# Altium footprint library CM3Board.PcbLib: 127 footprints (part 3 of 8)
Each footprint in its own frame and in the unit in brackets; x right, y up, seen from the top. Pads: shape width x height; smd on the part's side, far side on the other; paste and mask are expansions set on the pad; w line width, h text height; cw(c..) or ccw(c..) is an arc to the next point about the centre after c.
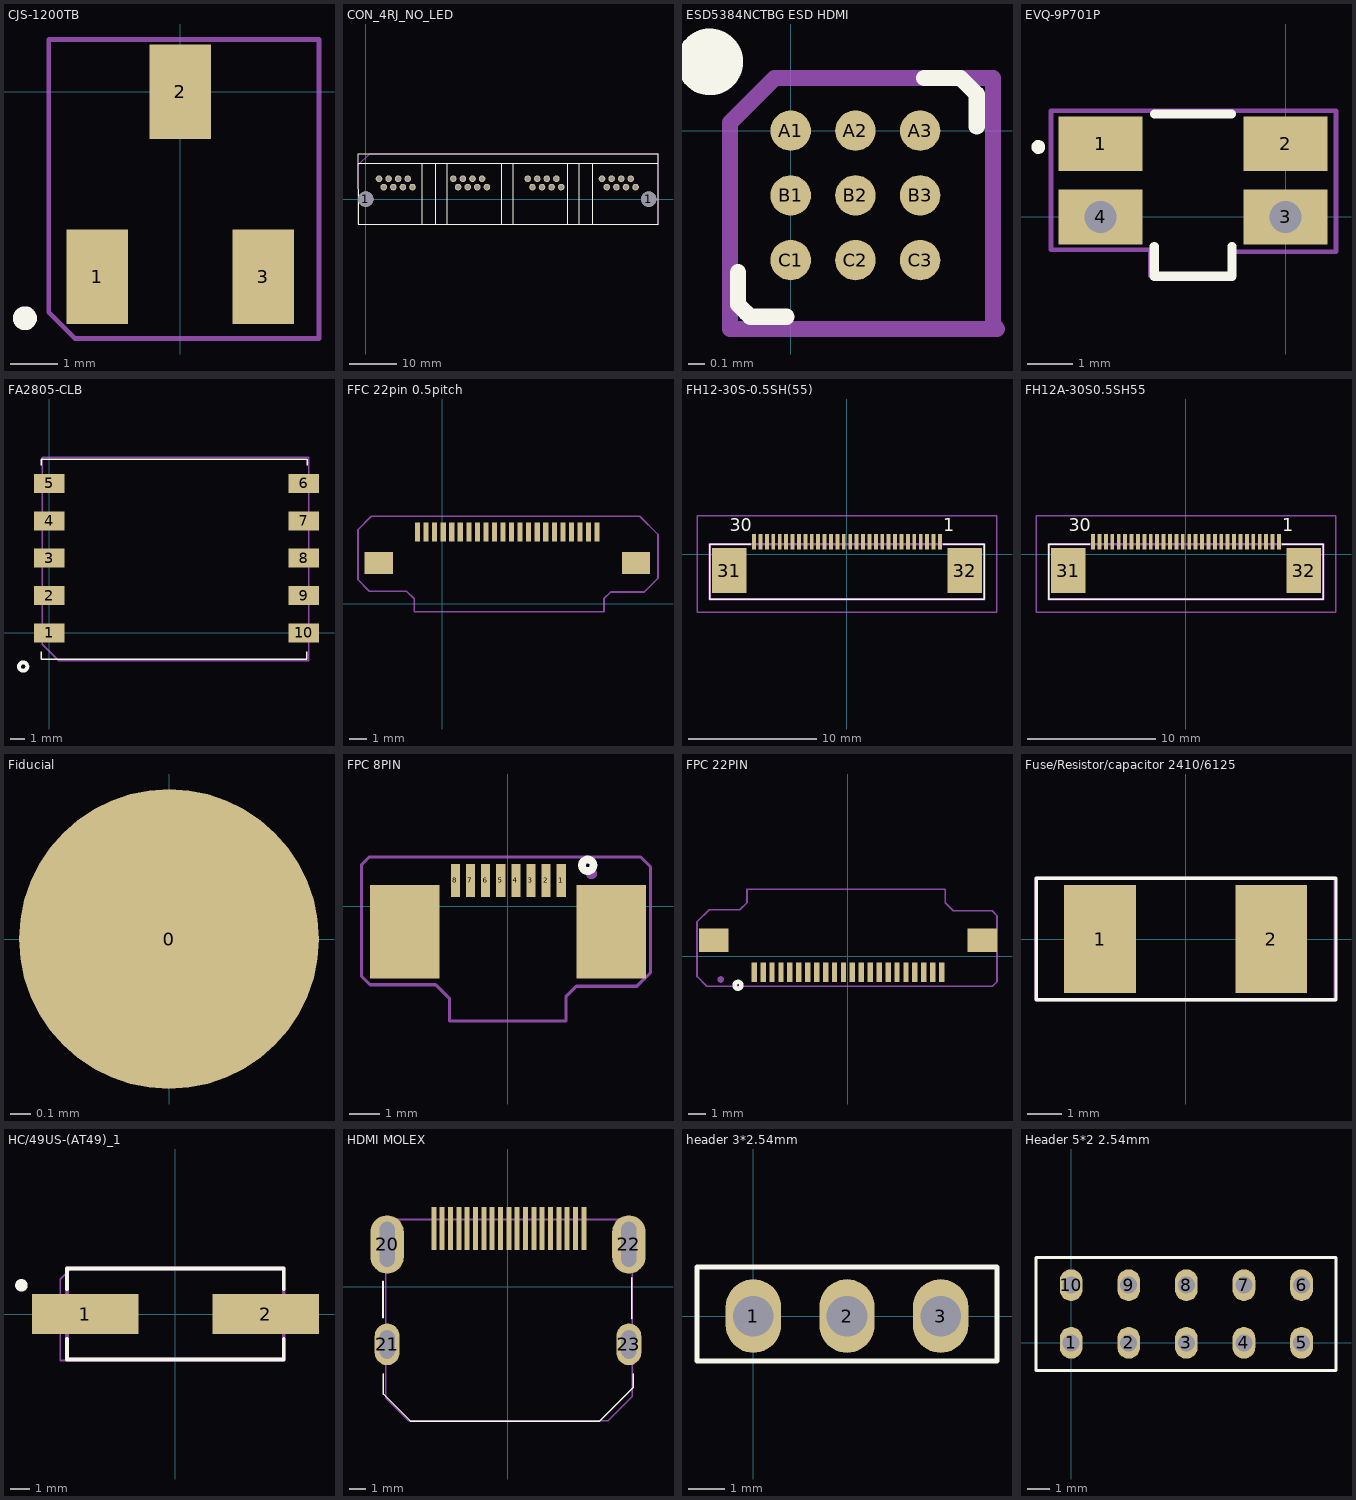
[diagram p2: the footprints below, top view; thin cyan lines are the x and y axes]

## CJS-1200TB [mm]
pads (3):
  rect 1.3x2 smd: 1(-1.75,-3.9) 2(0,0) 3(1.75,-3.9)
Top Overlay:
  circle w0.254: c-3.275,-4.775 r0.125
Mechanical 29:
  lines w0.1: -2.775,-4.65 -2.225,-5.2 2.925,-5.2 2.925,1.1 -2.775,1.1 -2.775,-4.65
  text ".Designator" at -0.825,-1.95 h1

## CON_4RJ_NO_LED [mm] "CON_4RJ_NO_LED"
pads (34):
  round 3.251 hole 3.251 unplated: 1(0,0) 1(59.94,0)
  round 1.4 / inner round 1.524 / far side round 1.4 hole 0.92: 1-1(9.895,2.54) 1-2(8.88,4.32) 1-3(7.865,2.54) 1-4(6.85,4.32) 1-5(5.835,2.54) 1-6(4.82,4.32) 1-7(3.805,2.54) 1-8(2.79,4.32) 2-1(25.645,2.54) 2-2(24.63,4.32) 2-3(23.615,2.54) 2-4(22.6,4.32) 2-5(21.585,2.54) 2-6(20.57,4.32) 2-7(19.555,2.54) 2-8(18.54,4.32) 3-1(41.395,2.54) 3-2(40.38,4.32) 3-3(39.365,2.54) 3-4(38.35,4.32) 3-5(37.335,2.54) 3-6(36.32,4.32) 3-7(35.305,2.54) 3-8(34.29,4.32) 4-1(57.145,2.54) 4-2(56.13,4.32) 4-3(55.115,2.54) 4-4(54.1,4.32) 4-5(53.085,2.54) 4-6(52.07,4.32) 4-7(51.055,2.54) 4-8(50.04,4.32)
Top Overlay:
  lines w0.152: 3.279,7.609 14.811,7.609 14.811,-5.243 ; 11.966,-5.294 11.966,7.457 ; 17.249,-5.243 17.249,7.609 28.781,7.609 28.781,-5.243 ; 31.219,-5.243 31.219,7.609 42.751,7.609 42.751,-5.243 ; 45.189,-5.243 45.189,7.609 56.721,7.609 ; 48.034,-5.294 48.034,7.482
  lines w0.2: -1.636,7.618 61.9,7.618
  lines w0.254: -1.654,9.584 61.9,9.599 61.9,-5.35 -1.624,-5.35 -1.654,9.586
Mechanical 29:
  lines w0.1: -1.575,-5.3 61.875,-5.3 61.9,-5.275 61.9,9.575 61.85,9.625 0.825,9.625 -1.575,7.225 -1.575,-5.3
  text ".Designator" at 27.35,-1.525 h1
3D body "ACC-M-RJHSE-5080-04-REVT2.step": height 13.16, standoff -3.15, extent -1.567,-5.193 61.425,9.793

## ESD5384NCTBG ESD HDMI [mm]
pads (9):
  round 0.25 smd: A1(0,0) A2(0.4,0) A3(0.8,0) B1(0,-0.4) B2(0.4,-0.4) B3(0.8,-0.4) C1(0,-0.8) C2(0.4,-0.8) C3(0.8,-0.8)
Top Overlay:
  circle w0.254: c-0.5,0.425 r0.079
  lines w0.1: -0.325,-0.875 -0.325,-1.075 -0.275,-1.125 -0.25,-1.15 -0.025,-1.15 ; 0.825,0.325 1.05,0.325 1.15,0.225 1.15,0.025
Mechanical 29:
  lines w0.1: -0.375,-1.225 -0.375,0.05 -0.1,0.325 1.25,0.325 1.25,-1.2 1.275,-1.225 -0.375,-1.225
  text ".Designator" at 0.125,-0.675 h1
3D body "ESD5384NCTBG.stp": height 0.63, standoff 0, extent -0.17,-0.97 0.97,0.17

## EVQ-9P701P [mm]
pads (4):
  rect 1.84x1.2 smd: 1(-4.05,1.6) 2(0,1.6)
  rect 1.84x1.2 hole 0.7: 3(0,0) 4(-4.05,0)
Top Overlay:
  circle w0.2: c-5.412,1.529 r0.051
  lines w0.2: -2.875,-0.65 -2.875,-1.3 -1.175,-1.3 -1.175,-0.65 ; -2.867,2.25 -1.183,2.25
Mechanical 29:
  lines w0.1: -5.135,-0.72 -5.135,2.32 1.105,2.32 1.105,-0.76 -1.165,-0.76 -1.165,-1.29 -2.965,-1.29 -2.965,-0.72 -5.135,-0.72
  text ".Designator" at -4.955,0.28 h1.52
3D body "EVQ-9P7_P34-01P.STEP": height 1.35, standoff -0.6, extent -4.375,-1.29 0.325,2.404

## FA2805-CLB [mm]
pads (10):
  rect 2.03x1.27 smd: 1(0,0) 2(0,2.5) 3(0,5) 4(0,7.5) 5(0,10) 6(17.02,10) 7(17.02,7.5) 8(17.02,5) 9(17.02,2.5) 10(17.02,0)
Top Overlay:
  circle w0.254: c-1.75,-2.25 r0.28
  lines w0.1: -0.55,11.225 -0.55,11.625 17.25,11.625 17.25,11.225 ; -0.525,-1.25 -0.525,-1.775 17.225,-1.775 17.225,-1.25
Mechanical 29:
  lines w0.1: -0.475,-0.75 0.625,-1.85 17.35,-1.85 17.35,11.75 -0.475,11.75 -0.475,-0.75
  text ".Designator" at 4.65,3.775 h1
3D body "FA2805-CLB.stp": height 12.7, standoff 0, extent -0.525,-1.78 17.225,11.68

## FFC 22pin 0.5pitch [mm]
pads (24):
  rect 0.3x1.1 smd: 1(-1.44,4.202) 2(-0.94,4.202) 3(-0.44,4.202) 4(0.06,4.202) 5(0.56,4.202) 6(1.06,4.202) 7(1.56,4.202) 8(2.06,4.202) 9(2.56,4.202) 10(3.06,4.202) 11(3.56,4.202) 12(4.06,4.202) 13(4.56,4.202) 14(5.06,4.202) 15(5.56,4.202) 16(6.06,4.202) 17(6.56,4.202) 18(7.06,4.202) 19(7.56,4.202) 20(8.06,4.202) 21(8.56,4.202) 22(9.06,4.202)
  rect 1.65x1.3 smd: ""(-3.715,2.402) ""(11.335,2.402)
Mechanical 29:
  lines w0.1: -4.925,1.412 -4.265,0.752 -2.09,0.752 -1.64,0.302 -1.64,-0.448 9.46,-0.448 9.46,0.302 9.86,0.702 11.827,0.702 12.625,1.5 12.625,4.062 11.562,5.125 -4.142,5.125 -4.925,4.342 -4.925,1.412
  text ".Designator" at -0.265,2.302 h1
3D body "FFC22_545482271.stp": height 1.18, standoff -0.02, extent -4.29,-0.548 11.91,4.452

## FH12-30S-0.5SH(55) [mm]
pads (32):
  rect 0.3x1.2 smd: 1(7.25,0.97) 2(6.75,0.97) 3(6.25,0.97) 4(5.75,0.97) 5(5.25,0.97) 6(4.75,0.97) 7(4.25,0.97) 8(3.75,0.97) 9(3.25,0.97) 10(2.75,0.97) 11(2.25,0.97) 12(1.75,0.97) 13(1.25,0.97) 14(0.75,0.97) 15(0.25,0.97) 16(-0.25,0.97) 17(-0.75,0.97) 18(-1.25,0.97) 19(-1.75,0.97) 20(-2.25,0.97) 21(-2.75,0.97) 22(-3.25,0.97) 23(-3.75,0.97) 24(-4.25,0.97) 25(-4.75,0.97) 26(-5.25,0.97) 27(-5.75,0.97) 28(-6.25,0.97) 29(-6.75,0.97) 30(-7.25,0.97)
  rect 2.7x3.5 smd: 31(-9.18,-1.3) 32(9.18,-1.3)
Top Overlay:
  lines w0.1: -7.5,0.77 -10.7,0.77 -10.7,-3.53 10.7,-3.53 10.7,0.77 7.5,0.77
  text "1" at 7.5,1.76 h1
  text "30" at -9.144,1.76 h1
Mechanical 13:
  lines w0.2: -10.7,-3.53 -10.7,0.77 10.7,0.77 10.7,-3.53 -10.7,-3.53
Mechanical 15:
  lines w0.1: -11.7,-4.53 -11.7,2.97 11.7,2.97 11.7,-4.53 -11.7,-4.53
Mechanical 29:
  text ".Designator" at -3.556,-2.304 h1
3D body "FH12-30S-0.5SH.stp": height 2.04, standoff -0.06, extent -9.55,-5.257 9.55,1.143

## FH12A-30S0.5SH55 [mm]
pads (32):
  rect 0.3x1.2 smd: 1(7.25,0.97) 2(6.75,0.97) 3(6.25,0.97) 4(5.75,0.97) 5(5.25,0.97) 6(4.75,0.97) 7(4.25,0.97) 8(3.75,0.97) 9(3.25,0.97) 10(2.75,0.97) 11(2.25,0.97) 12(1.75,0.97) 13(1.25,0.97) 14(0.75,0.97) 15(0.25,0.97) 16(-0.25,0.97) 17(-0.75,0.97) 18(-1.25,0.97) 19(-1.75,0.97) 20(-2.25,0.97) 21(-2.75,0.97) 22(-3.25,0.97) 23(-3.75,0.97) 24(-4.25,0.97) 25(-4.75,0.97) 26(-5.25,0.97) 27(-5.75,0.97) 28(-6.25,0.97) 29(-6.75,0.97) 30(-7.25,0.97)
  rect 2.7x3.5 smd: 31(-9.18,-1.3) 32(9.18,-1.3)
Top Overlay:
  lines w0.1: -7.5,0.77 -10.7,0.77 -10.7,-3.53 10.7,-3.53 10.7,0.77 7.5,0.77
  text "30" at -9.144,1.76 h1
  text "1" at 7.5,1.76 h1
Mechanical 13:
  lines w0.2: -10.7,-3.53 10.7,-3.53 10.7,0.77 -10.7,0.77 -10.7,-3.53
Mechanical 15:
  lines w0.1: -11.7,-4.53 11.7,-4.53 11.7,2.97 -11.7,2.97 -11.7,-4.53
Mechanical 29:
  text ".Designator" at -3.556,-2.304 h1
3D body "FH12A-30S-0.5SH.stp": height 2.15, standoff 0, extent -9.75,-5.857 9.75,1.143

## Fiducial [mm]
pads (1):
  round 1.5 smd paste-1 mask+3: 0(0,0)

## FPC 8PIN [mm]
pads (10):
  rect 0.3x1.1 smd: 1(1.76,0.85) 2(1.26,0.85) 3(0.76,0.85) 4(0.26,0.85) 5(-0.24,0.85) 6(-0.74,0.85) 7(-1.24,0.85) 8(-1.74,0.85)
  rect 2.3x3.1 smd: ""(-3.41,-0.85) ""(3.41,-0.85)
Top Overlay:
  circle w0.254: c2.635,1.35 r0.19
Mechanical 29:
  circle w0.254: c2.76,1.075 r0.056
  lines w0.1: -4.84,-2.325 -4.84,1.375 -4.59,1.625 4.385,1.625 4.71,1.3 4.71,-2.2 4.26,-2.65 2.26,-2.65 1.91,-3 1.91,-3.8 -1.94,-3.8 -1.94,-3.05 -2.39,-2.6 -4.565,-2.6 -4.84,-2.325
  text ".Designator" at -3.89,-0.95 h1
3D body "TE-8PFC.stp": height 2.1, standoff 0.05, extent -4.705,-3.86 4.725,1.25

## FPC 22PIN [mm]
pads (24):
  rect 0.3x1.1 smd: 1(-5.25,-0.9) 2(-4.75,-0.9) 3(-4.25,-0.9) 4(-3.75,-0.9) 5(-3.25,-0.9) 6(-2.75,-0.9) 7(-2.25,-0.9) 8(-1.75,-0.9) 9(-1.25,-0.9) 10(-0.75,-0.9) 11(-0.25,-0.9) 12(0.25,-0.9) 13(0.75,-0.9) 14(1.25,-0.9) 15(1.75,-0.9) 16(2.25,-0.9) 17(2.75,-0.9) 18(3.25,-0.9) 19(3.75,-0.9) 20(4.25,-0.9) 21(4.75,-0.9) 22(5.25,-0.9)
  rect 1.65x1.3 smd: ""(-7.525,0.9) ""(7.525,0.9)
Top Overlay:
  circle w0.254: c-6.15,-1.625 r0.19
Mechanical 29:
  circle w0.254: c-7.125,-1.3 r0.056
  lines w0.1: -8.45,-1.125 -7.9,-1.675 8.1,-1.675 8.35,-1.425 8.35,2.275 8.075,2.55 5.9,2.55 5.45,3 5.45,3.75 -5.65,3.75 -5.65,3 -6.05,2.6 -7.775,2.6 -8.45,1.925 -8.45,-1.125
  text ".Designator" at 4.075,1 h1
3D body "FFC22_545482271.stp": height 1.18, standoff -0.02, extent -8.1,-1.15 8.1,3.85

## Fuse/Resistor/capacitor 2410/6125 [mm]
pads (2):
  rect 2.1x3.15 smd: 1(-2.5,0) 2(2.5,0)
Top Overlay:
  lines w0.1: -4.37,-1.778 -4.37,1.778 4.393,1.778 4.393,-1.778 -4.37,-1.778
Mechanical 29:
  lines w0.1: -4.375,-1.75 -4.375,1.775 4.35,1.775 4.375,1.75 4.375,-1.775 -4.35,-1.775 -4.375,-1.75
  text ".Designator" at -4.15,-1.375 h1
3D body "User Library-Fuse2.step": height 2.47, standoff -0.13, extent -3,-1.35 3.1,1.25

## HC/49US-(AT49)_1 [mm]
pads (2):
  rect 5.6x2.1 smd: 1(-4.75,0) 2(4.75,0)
Top Overlay:
  circle w0.4: c-8.105,1.51 r0.126
  lines w0.2: -5.7,-1.3 -5.7,-2.4 5.7,-2.4 5.7,-1.3 ; -5.7,1.3 -5.7,2.4 5.7,2.4 5.7,1.3
Mechanical 13:
  lines w0.2: -5.7,-2.4 5.7,-2.4 5.7,2.4 -5.7,2.4 -5.7,-2.4
Mechanical 29:
  lines w0.1: -6.06,-2.45 5.74,-2.45 5.74,2.38 -5.52,2.38 -6.06,1.84 -6.06,-2.45
  text ".Designator" at -3.16,-1.36 h1.52
3D body "User Library-HC49US.STEP": height 4.2, standoff 0, extent -6.16,-2.35 6.54,2.35

## HDMI MOLEX [mm] "Modelo 471511051"
pads (23):
  rect 0.3x2.6 smd: 1(4.55,3.475) 2(4.05,3.475) 3(3.55,3.475) 4(3.05,3.475) 5(2.55,3.475) 6(2.05,3.475) 7(1.55,3.475) 8(1.05,3.475) 9(0.55,3.475) 10(0.05,3.475) 11(-0.45,3.475) 12(-0.95,3.475) 13(-1.45,3.475) 14(-1.95,3.475) 15(-2.45,3.475) 16(-2.95,3.475) 17(-3.45,3.475) 18(-3.95,3.475) 19(-4.45,3.475)
  oval 2x3.5 hole 0.9 slot 2.7 at 90 deg: 20(-7.25,2.525) 22(7.25,2.525)
  oval 1.5x2.5 hole 0.9 slot 1.7 at 90 deg: 21(-7.25,-3.475) 23(7.25,-3.475)
Top Overlay:
  lines w0.1: -7.5,-1.875 -7.5,0.3 ; -7.475,-5.25 -7.475,-6.45 -5.85,-8.075 5.5,-8.075 7.525,-6.05 7.525,-5.25 ; 7.425,-1.925 7.425,0.525
Mechanical 29:
  lines w0.1: -7.325,-6.7 -5.975,-8.05 6,-8.05 7.45,-6.6 7.45,3.875 7.3,4.025 -7.325,4.025 -7.325,-6.7
  text ".Designator" at -1.225,-2.675 h1
3D body "HDMI_MOLEX471511051.stp": height 6.28, standoff -2.1, extent -7.475,-8.1 7.525,4.05

## header 3*2.54mm [mm]
pads (3):
  oval 1.5x2 hole 1.1: 1(0,0) 2(2.54,0) 3(5.08,0)
Top Overlay:
  lines w0.127: -1.53,-1.22 6.61,-1.22 6.61,1.33 -1.53,1.33 -1.53,-1.22
Mechanical 29:
  text ".Designator" at 0.61,-0.45 h1
3D body "User Library-zl262-3s_p2-54_l8-12_w2-54_h8-5.step": height 8.5, standoff -3, extent -1.51,-1.22 6.61,1.32

## Header 5*2 2.54mm [mm]
pads (10):
  oval 1x1.4 hole 0.75: 1(0,0) 2(2.54,0) 3(5.08,0) 4(7.62,0) 5(10.16,0) 6(10.16,2.54) 7(7.62,2.54) 8(5.08,2.54) 9(2.54,2.54) 10(0,2.54)
Top Overlay:
  lines w0.127: -1.53,3.77 -1.55,3.77 ; -1.55,3.77 -1.55,-1.23 11.68,-1.23 11.68,-0.68 11.68,3.77 -1.55,3.77
Mechanical 29:
  text ".Designator" at 2.89,1.39 h1
3D body "User Library-zl262-10d_p2-54_l13-2_w5_h8-5.step": height 8.5, standoff -3, extent -1.52,-1.23 11.68,3.77